# Altium footprint library SG__PCB_HOLE_Connector.PcbLib: 154 footprints (part 6 of 10)
Each footprint in its own frame and in the unit in brackets; x right, y up, seen from the top. Pads: shape width x height; smd on the part's side, far side on the other; paste and mask are expansions set on the pad; w line width, h text height; cw(c..) or ccw(c..) is an arc to the next point about the centre after c.
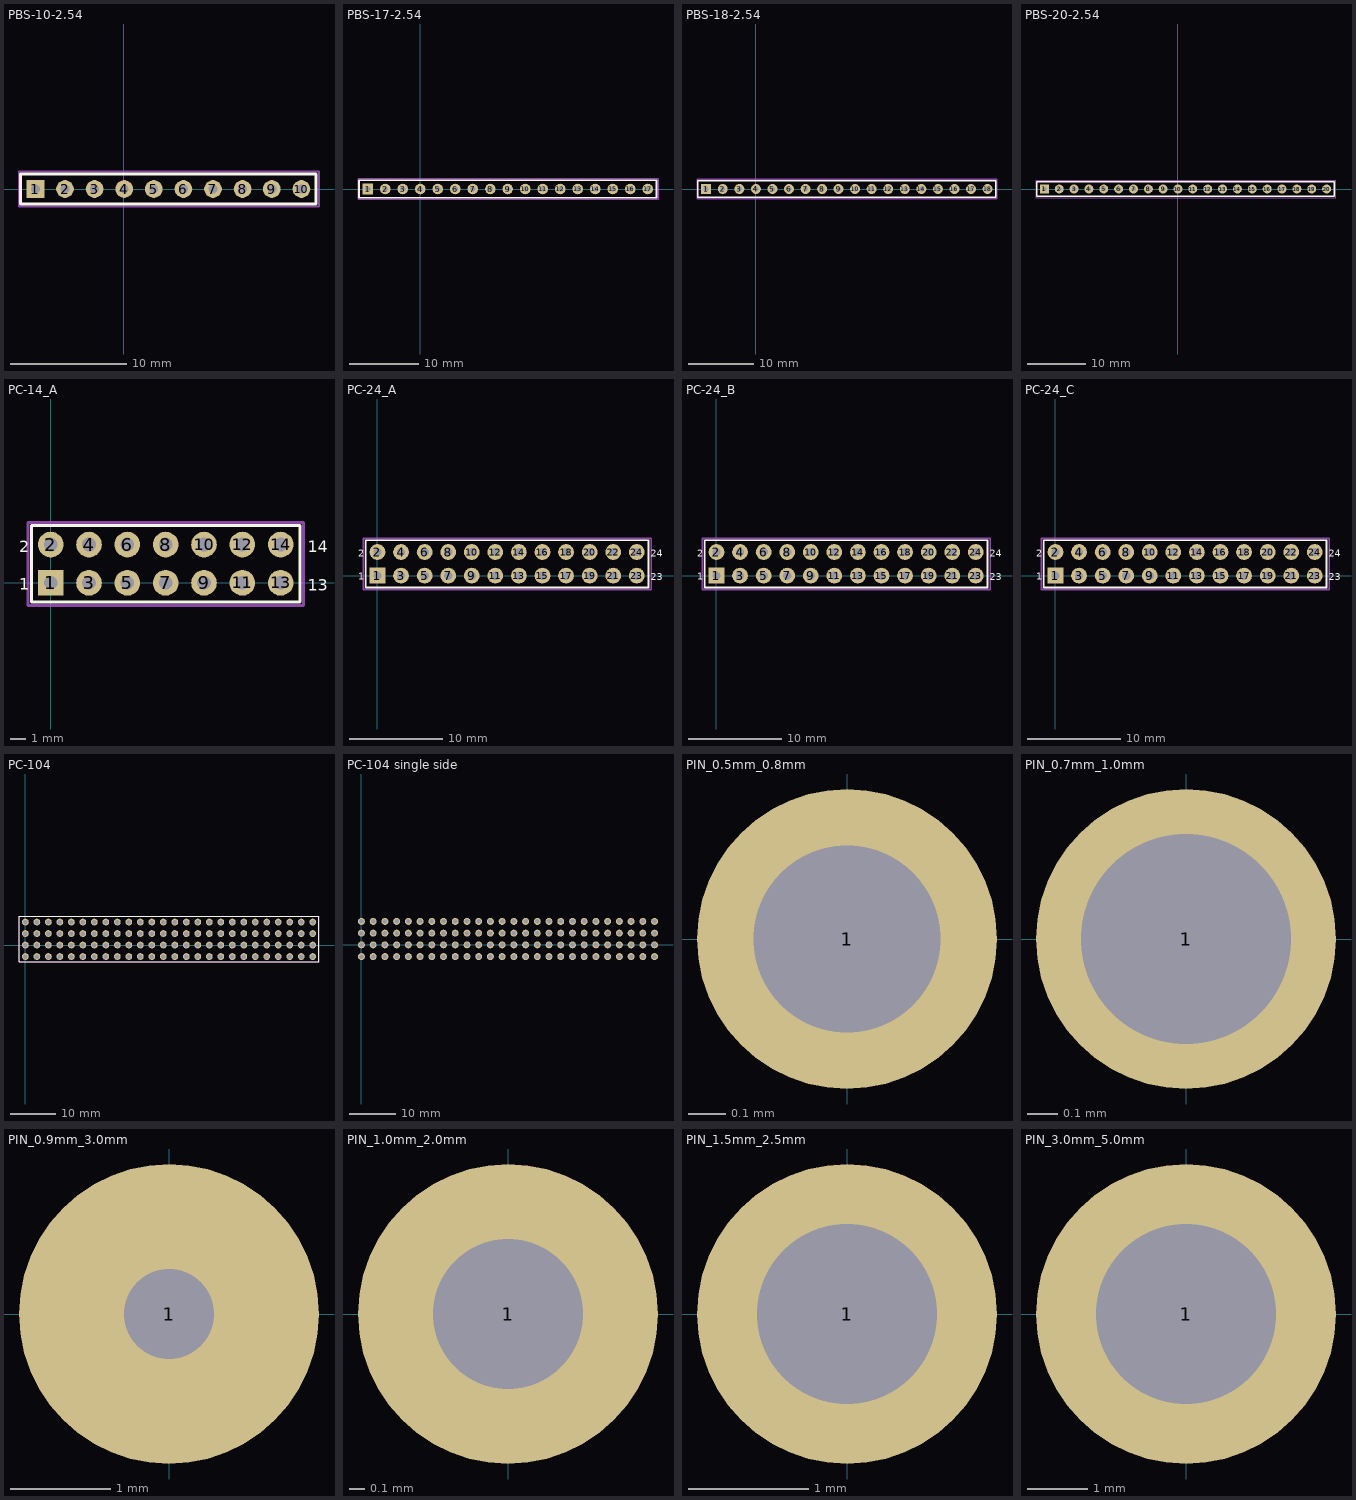
[diagram p5: the footprints below, top view; thin cyan lines are the x and y axes]

## PBS-10-2.54 [mil]
pads (10):
  rect 60x60 hole 30: 1(-298.82,0)
  round 60 hole 30: 2(-198.82,0) 3(-98.82,0) 4(1.18,0) 5(101.18,0) 6(201.18,0) 7(301.18,0) 8(401.18,0) 9(500,0) 10(600,0)
Top Overlay:
  lines w10: 46.85,-50 650,-50 650,50 46.85,50 ; 51.18,-50 -348.82,-50 -348.82,50 51.18,50
Top Courtyard:
  lines w7.87: -354.33,-59.06 -354.33,59.06 659.45,59.06 659.45,-59.06 -354.33,-59.06
3D body "PBS1-2.54.stp": height 334.65, standoff -124.02, extent -148.82,-50 -48.82,50
3D body "PBS1-2.54.stp": height 334.65, standoff -124.02, extent -48.82,-50 51.18,50
3D body "PBS1-2.54.stp": height 334.65, standoff -124.02, extent 51.18,-50 151.18,50
3D body "PBS1-2.54.stp": height 334.65, standoff -124.02, extent 151.18,-50 251.18,50
3D body "PBS1-2.54.stp": height 334.65, standoff -124.02, extent 251.18,-50 351.18,50
3D body "PBS1-2.54.stp": height 334.65, standoff -124.02, extent 351.18,-50 451.18,50
3D body "PBS1-2.54.stp": height 334.65, standoff -124.02, extent 450,-50 550,50
3D body "PBS1-2.54.stp": height 334.65, standoff -124.02, extent 550,-50 650,50
3D body "PBS1-2.54.stp": height 334.65, standoff -124.02, extent -348.82,-50 -248.82,50
3D body "PBS1-2.54.stp": height 334.65, standoff -124.02, extent -248.82,-50 -148.82,50

## PBS-17-2.54 [mil]
pads (17):
  rect 60x60 hole 30: 1(-298.82,0)
  round 60 hole 30: 2(-198.82,0) 3(-98.82,0) 4(1.18,0) 5(101.18,0) 6(201.18,0) 7(301.18,0) 8(401.18,0) 9(500,0) 10(600,0) 11(700,0) 12(800,0) 13(900,0) 14(1000,0) 15(1100,0) 16(1200,0) 17(1300,0)
Top Overlay:
  lines w10: 46.85,-50 1350,-50 1350,50 46.85,50 ; 51.18,-50 -348.82,-50 -348.82,50 51.18,50
Top Courtyard:
  lines w7.87: -354.33,-59.06 -354.33,59.06 1358.27,59.06 1358.27,-59.06 -354.33,-59.06
3D body "PBS1-2.54.stp": height 334.65, standoff -124.02, extent -348.82,-50 -248.82,50
3D body "PBS1-2.54.stp": height 334.65, standoff -124.02, extent -248.82,-50 -148.82,50
3D body "PBS1-2.54.stp": height 334.65, standoff -124.02, extent -148.82,-50 -48.82,50
3D body "PBS1-2.54.stp": height 334.65, standoff -124.02, extent -48.82,-50 51.18,50
3D body "PBS1-2.54.stp": height 334.65, standoff -124.02, extent 51.18,-50 151.18,50
3D body "PBS1-2.54.stp": height 334.65, standoff -124.02, extent 151.18,-50 251.18,50
3D body "PBS1-2.54.stp": height 334.65, standoff -124.02, extent 251.18,-50 351.18,50
3D body "PBS1-2.54.stp": height 334.65, standoff -124.02, extent 351.18,-50 451.18,50
3D body "PBS1-2.54.stp": height 334.65, standoff -124.02, extent 450,-50 550,50
3D body "PBS1-2.54.stp": height 334.65, standoff -124.02, extent 550,-50 650,50
3D body "PBS1-2.54.stp": height 334.65, standoff -124.02, extent 650,-50 750,50
3D body "PBS1-2.54.stp": height 334.65, standoff -124.02, extent 750,-50 850,50
3D body "PBS1-2.54.stp": height 334.65, standoff -124.02, extent 850,-50 950,50
3D body "PBS1-2.54.stp": height 334.65, standoff -124.02, extent 950,-50 1050,50
3D body "PBS1-2.54.stp": height 334.65, standoff -124.02, extent 1050,-50 1150,50
3D body "PBS1-2.54.stp": height 334.65, standoff -124.02, extent 1150,-50 1250,50
3D body "PBS1-2.54.stp": height 334.65, standoff -124.02, extent 1250,-50 1350,50

## PBS-18-2.54 [mil]
pads (18):
  rect 60x60 hole 30: 1(-298.82,0)
  round 60 hole 30: 2(-198.82,0) 3(-98.82,0) 4(1.18,0) 5(101.18,0) 6(201.18,0) 7(301.18,0) 8(401.18,0) 9(500,0) 10(600,0) 11(700,0) 12(800,0) 13(900,0) 14(1000,0) 15(1100,0) 16(1200,0) 17(1300,0) 18(1400,0)
Top Overlay:
  lines w10: 46.85,-50 1450,-50 1450,50 46.85,50 ; 51.18,-50 -348.82,-50 -348.82,50 51.18,50
Top Courtyard:
  lines w7.87: -354.33,-59.06 1456.69,-59.06 1456.69,59.06 -354.33,59.06 -354.33,-59.06
3D body "PBS1-2.54.stp": height 334.65, standoff -124.02, extent 850,-50 950,50
3D body "PBS1-2.54.stp": height 334.65, standoff -124.02, extent 950,-50 1050,50
3D body "PBS1-2.54.stp": height 334.65, standoff -124.02, extent 1050,-50 1150,50
3D body "PBS1-2.54.stp": height 334.65, standoff -124.02, extent 1150,-50 1250,50
3D body "PBS1-2.54.stp": height 334.65, standoff -124.02, extent 1250,-50 1350,50
3D body "PBS1-2.54.stp": height 334.65, standoff -124.02, extent 1350,-50 1450,50
3D body "PBS1-2.54.stp": height 334.65, standoff -124.02, extent -348.82,-50 -248.82,50
3D body "PBS1-2.54.stp": height 334.65, standoff -124.02, extent -248.82,-50 -148.82,50
3D body "PBS1-2.54.stp": height 334.65, standoff -124.02, extent -148.82,-50 -48.82,50
3D body "PBS1-2.54.stp": height 334.65, standoff -124.02, extent -48.82,-50 51.18,50
3D body "PBS1-2.54.stp": height 334.65, standoff -124.02, extent 51.18,-50 151.18,50
3D body "PBS1-2.54.stp": height 334.65, standoff -124.02, extent 151.18,-50 251.18,50
3D body "PBS1-2.54.stp": height 334.65, standoff -124.02, extent 251.18,-50 351.18,50
3D body "PBS1-2.54.stp": height 334.65, standoff -124.02, extent 351.18,-50 451.18,50
3D body "PBS1-2.54.stp": height 334.65, standoff -124.02, extent 450,-50 550,50
3D body "PBS1-2.54.stp": height 334.65, standoff -124.02, extent 550,-50 650,50
3D body "PBS1-2.54.stp": height 334.65, standoff -124.02, extent 650,-50 750,50
3D body "PBS1-2.54.stp": height 334.65, standoff -124.02, extent 750,-50 850,50

## PBS-20-2.54 [mil]
pads (20):
  rect 60x60 hole 30: 1(-898.82,0)
  round 60 hole 30: 2(-798.82,0) 3(-698.82,0) 4(-598.82,0) 5(-498.82,0) 6(-398.82,0) 7(-298.82,0) 8(-198.82,0) 9(-100,0) 10(0,0) 11(100,0) 12(200,0) 13(300,0) 14(400,0) 15(500,0) 16(600,0) 17(700,0) 18(800,0) 19(900,0) 20(1000,0)
Top Overlay:
  lines w10: -553.15,-50 1050.01,-50 1050.01,50 -553.15,50 ; -548.82,-50 -948.82,-50 -948.82,50 -548.82,50
Top Courtyard:
  lines w7.87: -954.72,-59.06 1062.99,-59.06 1062.99,59.06 -954.72,59.06 -954.72,-59.06
3D body "PBS1-2.54.stp": height 334.65, standoff -124.02, extent 850,-50 950,50
3D body "PBS1-2.54.stp": height 334.65, standoff -124.02, extent 750,-50 850,50
3D body "PBS1-2.54.stp": height 334.65, standoff -124.02, extent 650,-50 750,50
3D body "PBS1-2.54.stp": height 334.65, standoff -124.02, extent 550,-50 650,50
3D body "PBS1-2.54.stp": height 334.65, standoff -124.02, extent 450,-50 550,50
3D body "PBS1-2.54.stp": height 334.65, standoff -124.02, extent 350,-50 450,50
3D body "PBS1-2.54.stp": height 334.65, standoff -124.02, extent 250,-50 350,50
3D body "PBS1-2.54.stp": height 334.65, standoff -124.02, extent 150,-50 250,50
3D body "PBS1-2.54.stp": height 334.65, standoff -124.02, extent 50,-50 150,50
3D body "PBS1-2.54.stp": height 334.65, standoff -124.02, extent -50,-50 50,50
3D body "PBS1-2.54.stp": height 334.65, standoff -124.02, extent -150,-50 -50,50
3D body "PBS1-2.54.stp": height 334.65, standoff -124.02, extent -248.82,-50 -148.82,50
3D body "PBS1-2.54.stp": height 334.65, standoff -124.02, extent -348.82,-50 -248.82,50
3D body "PBS1-2.54.stp": height 334.65, standoff -124.02, extent -448.82,-50 -348.82,50
3D body "PBS1-2.54.stp": height 334.65, standoff -124.02, extent -548.82,-50 -448.82,50
3D body "PBS1-2.54.stp": height 334.65, standoff -124.02, extent -648.82,-50 -548.82,50
3D body "PBS1-2.54.stp": height 334.65, standoff -124.02, extent -748.82,-50 -648.82,50
3D body "PBS1-2.54.stp": height 334.65, standoff -124.02, extent -848.82,-50 -748.82,50
3D body "PBS1-2.54.stp": height 334.65, standoff -124.02, extent -948.82,-50 -848.82,50
3D body "PBS1-2.54.stp": height 334.65, standoff -124.02, extent 950,-50 1050,50

## PC-14_A [mm]
pads (14):
  rect 1.7x1.7 hole 0.9: 1(0,0)
  round 1.7 hole 0.9: 2(0,2.54) 3(2.54,0) 4(2.54,2.54) 5(5.08,0) 6(5.08,2.54) 7(7.62,0) 8(7.62,2.54) 9(10.16,0) 10(10.16,2.54) 11(12.7,0) 12(12.7,2.54) 13(15.24,0) 14(15.24,2.54)
Top Overlay:
  lines w0.2: -1.27,-1.27 16.535,-1.27 16.535,3.81 -1.27,3.81 -1.27,-1.27
  text "14" at 17.018,2.032 h0.76
  text "13" at 17.018,-0.508 h0.76
  text "2" at -2.1,2.04 h0.76
  text "1" at -2.1,-0.46 h0.76
Top Courtyard:
  lines w0.2: -1.5,-1.5 -1.5,4 16.75,4 16.75,-1.5 -1.5,-1.5
3D body "PC104-14.stp": height 11.68, standoff -12.32, extent -1.27,-1.39 16.51,3.879

## PC-24_A [mm]
pads (24):
  rect 1.7x1.7 hole 0.9: 1(0,0)
  round 1.7 hole 0.9: 2(0,2.54) 3(2.54,0) 4(2.54,2.54) 5(5.08,0) 6(5.08,2.54) 7(7.62,0) 8(7.62,2.54) 9(10.16,0) 10(10.16,2.54) 11(12.7,0) 12(12.7,2.54) 13(15.24,0) 14(15.24,2.54) 15(17.78,0) 16(17.78,2.54) 17(20.32,0) 18(20.32,2.54) 19(22.86,0) 20(22.86,2.54) 21(25.4,0) 22(25.4,2.54) 23(27.94,0) 24(27.94,2.54)
Top Overlay:
  lines w0.2: -1.27,-1.27 -1.27,3.81 29.21,3.81 29.21,-1.27 -1.27,-1.27
  text "1" at -2.1,-0.46 h0.76
  text "2" at -2.1,2.04 h0.76
  text "23" at 29.464,-0.508 h0.76
  text "24" at 29.464,2.032 h0.76
Top Courtyard:
  lines w0.2: -1.5,-1.5 29.5,-1.5 29.5,4 -1.5,4 -1.5,-1.5
3D body "разъем 12x2 pin 2mm.STEP": height 11, standoff -2, extent -1.4,-1.27 29.34,3.81

## PC-24_B [mm]
pads (24):
  rect 1.7x1.7 hole 0.9: 1(0,0)
  round 1.7 hole 0.9: 2(0,2.54) 3(2.54,0) 4(2.54,2.54) 5(5.08,0) 6(5.08,2.54) 7(7.62,0) 8(7.62,2.54) 9(10.16,0) 10(10.16,2.54) 11(12.7,0) 12(12.7,2.54) 13(15.24,0) 14(15.24,2.54) 15(17.78,0) 16(17.78,2.54) 17(20.32,0) 18(20.32,2.54) 19(22.86,0) 20(22.86,2.54) 21(25.4,0) 22(25.4,2.54) 23(27.94,0) 24(27.94,2.54)
Top Overlay:
  lines w0.2: -1.27,-1.27 -1.27,3.81 29.21,3.81 29.21,-1.27 -1.27,-1.27
  text "1" at -2.1,-0.46 h0.76
  text "2" at -2.1,2.04 h0.76
  text "23" at 29.464,-0.508 h0.76
  text "24" at 29.464,2.032 h0.76
Top Courtyard:
  lines w0.2: -1.5,-1.5 -1.5,4 29.5,4 29.5,-1.5 -1.5,-1.5
3D body "PC-24_B__ByAnRx.SLDPRT": height 11, standoff -7, extent -1.4,-1.27 29.34,3.81

## PC-24_C [mm]
pads (24):
  rect 1.7x1.7 hole 0.9: 1(0,0)
  round 1.7 hole 0.9: 2(0,2.54) 3(2.54,0) 4(2.54,2.54) 5(5.08,0) 6(5.08,2.54) 7(7.62,0) 8(7.62,2.54) 9(10.16,0) 10(10.16,2.54) 11(12.7,0) 12(12.7,2.54) 13(15.24,0) 14(15.24,2.54) 15(17.78,0) 16(17.78,2.54) 17(20.32,0) 18(20.32,2.54) 19(22.86,0) 20(22.86,2.54) 21(25.4,0) 22(25.4,2.54) 23(27.94,0) 24(27.94,2.54)
Top Overlay:
  lines w0.2: -1.27,-1.27 29.21,-1.27 29.21,3.81 -1.27,3.81 -1.27,-1.27
  text "24" at 29.464,2.032 h0.76
  text "23" at 29.464,-0.508 h0.76
  text "2" at -2.1,2.04 h0.76
  text "1" at -2.1,-0.46 h0.76
Top Courtyard:
  lines w0.2: -1.5,-1.5 29.5,-1.5 29.5,4 -1.5,4 -1.5,-1.5
3D body "разъем 12x2 pin.STEP": height 11, standoff -12, extent -1.4,-1.27 29.34,3.81

## PC-104 [mm] "PC104"
pads (104):
  round 1.5 hole 1: 1(0,-2.54) 2(0,0) 3(2.54,-2.54) 4(2.54,0) 5(5.08,-2.54) 6(5.08,0) 7(7.62,-2.54) 8(7.62,0) 9(10.16,-2.54) 10(10.16,0) 11(12.7,-2.54) 12(12.7,0) 13(15.24,-2.54) 14(15.24,0) 15(17.78,-2.54) 16(17.78,0) 17(20.32,-2.54) 18(20.32,0) 19(22.86,-2.54) 20(22.86,0) 21(25.4,-2.54) 22(25.4,0) 23(27.94,-2.54) 24(27.94,0) 25(30.48,-2.54) 26(30.48,0) 27(33.02,-2.54) 28(33.02,0) 29(35.56,-2.54) 30(35.56,0) 31(38.1,-2.54) 32(38.1,0) 33(40.64,-2.54) 34(40.64,0) 35(43.18,-2.54) 36(43.18,0) 37(45.72,-2.54) 38(45.72,0) 39(48.26,-2.54) 40(48.26,0) 41(50.8,-2.54) 42(50.8,0) 43(53.34,-2.54) 44(53.34,0) 45(55.88,-2.54) 46(55.88,0) 47(58.42,-2.54) 48(58.42,0) 49(60.96,-2.54) 50(60.96,0) 51(63.5,-2.54) 52(63.5,0) 53(0,2.54) 54(0,5.08) 55(2.54,2.54) 56(2.54,5.08) 57(5.08,2.54) 58(5.08,5.08) 59(7.62,2.54) 60(7.62,5.08) 61(10.16,2.54) 62(10.16,5.08) 63(12.7,2.54) 64(12.7,5.08) 65(15.24,2.54) 66(15.24,5.08) 67(17.78,2.54) 68(17.78,5.08) 69(20.32,2.54) 70(20.32,5.08) 71(22.86,2.54) 72(22.86,5.08) 73(25.4,2.54) 74(25.4,5.08) 75(27.94,2.54) 76(27.94,5.08) 77(30.48,2.54) 78(30.48,5.08) 79(33.02,2.54) 80(33.02,5.08) 81(35.56,2.54) 82(35.56,5.08) 83(38.1,2.54) 84(38.1,5.08) 85(40.64,2.54) 86(40.64,5.08) 87(43.18,2.54) 88(43.18,5.08) 89(45.72,2.54) 90(45.72,5.08) 91(48.26,2.54) 92(48.26,5.08) 93(50.8,2.54) 94(50.8,5.08) 95(53.34,2.54) 96(53.34,5.08) 97(55.88,2.54) 98(55.88,5.08) 99(58.42,2.54) 100(58.42,5.08) 101(60.96,2.54) 102(60.96,5.08) 103(63.5,2.54) 104(63.5,5.08)
Top Overlay:
  lines w0.254: -1.41,-3.7 64.88,-3.7 64.88,6.38 -1.41,6.38 -1.41,-3.7
Top Assembly:
  lines w0.254: -1.41,-3.7 -1.41,6.38 64.88,6.38 64.88,-3.7 -1.41,-3.7
Top Courtyard:
  lines w0.254: -1.408,-3.706 64.882,-3.706 64.882,6.374 -1.408,6.374 -1.408,-3.706
Bottom Courtyard:
  lines w0.254: -1.409,-3.706 64.881,-3.706 64.881,6.374 -1.409,6.374 -1.409,-3.706
3D body "PC104-52.stp": height 12.23, standoff -11.77, extent -1.41,-3.742 64.63,1.338
3D body "PC104-52.stp": height 12.23, standoff -11.77, extent -1.41,1.338 64.63,6.418

## PC-104 single side [mm] "PC104"
pads (104):
  round 1.5 hole 1: 1(0,-2.54) 2(0,0) 3(2.54,-2.54) 4(2.54,0) 5(5.08,-2.54) 6(5.08,0) 7(7.62,-2.54) 8(7.62,0) 9(10.16,-2.54) 10(10.16,0) 11(12.7,-2.54) 12(12.7,0) 13(15.24,-2.54) 14(15.24,0) 15(17.78,-2.54) 16(17.78,0) 17(20.32,-2.54) 18(20.32,0) 19(22.86,-2.54) 20(22.86,0) 21(25.4,-2.54) 22(25.4,0) 23(27.94,-2.54) 24(27.94,0) 25(30.48,-2.54) 26(30.48,0) 27(33.02,-2.54) 28(33.02,0) 29(35.56,-2.54) 30(35.56,0) 31(38.1,-2.54) 32(38.1,0) 33(40.64,-2.54) 34(40.64,0) 35(43.18,-2.54) 36(43.18,0) 37(45.72,-2.54) 38(45.72,0) 39(48.26,-2.54) 40(48.26,0) 41(50.8,-2.54) 42(50.8,0) 43(53.34,-2.54) 44(53.34,0) 45(55.88,-2.54) 46(55.88,0) 47(58.42,-2.54) 48(58.42,0) 49(60.96,-2.54) 50(60.96,0) 51(63.5,-2.54) 52(63.5,0) 53(0,2.54) 54(0,5.08) 55(2.54,2.54) 56(2.54,5.08) 57(5.08,2.54) 58(5.08,5.08) 59(7.62,2.54) 60(7.62,5.08) 61(10.16,2.54) 62(10.16,5.08) 63(12.7,2.54) 64(12.7,5.08) 65(15.24,2.54) 66(15.24,5.08) 67(17.78,2.54) 68(17.78,5.08) 69(20.32,2.54) 70(20.32,5.08) 71(22.86,2.54) 72(22.86,5.08) 73(25.4,2.54) 74(25.4,5.08) 75(27.94,2.54) 76(27.94,5.08) 77(30.48,2.54) 78(30.48,5.08) 79(33.02,2.54) 80(33.02,5.08) 81(35.56,2.54) 82(35.56,5.08) 83(38.1,2.54) 84(38.1,5.08) 85(40.64,2.54) 86(40.64,5.08) 87(43.18,2.54) 88(43.18,5.08) 89(45.72,2.54) 90(45.72,5.08) 91(48.26,2.54) 92(48.26,5.08) 93(50.8,2.54) 94(50.8,5.08) 95(53.34,2.54) 96(53.34,5.08) 97(55.88,2.54) 98(55.88,5.08) 99(58.42,2.54) 100(58.42,5.08) 101(60.96,2.54) 102(60.96,5.08) 103(63.5,2.54) 104(63.5,5.08)
3D body "female_header_a-bl254-dg-g26d.stp": height 8.5, standoff -3.2, extent 31.61,1.38 64.88,6.38
3D body "female_header_a-bl254-dg-g26d.stp": height 8.5, standoff -3.2, extent 31.61,-3.7 64.88,1.3
3D body "female_header_a-bl254-dg-g26d.stp": height 8.5, standoff -3.2, extent -1.41,-3.7 31.86,1.3
3D body "female_header_a-bl254-dg-g26d.stp": height 8.5, standoff -3.2, extent -1.41,1.38 31.86,6.38

## PIN_0.5mm_0.8mm [mm] "Hole diam, out size diam"
pads (1):
  round 0.8 hole 0.5 mask-0.05: 1(0,0)

## PIN_0.7mm_1.0mm [mm] "Hole diam, out size diam"
pads (1):
  round 1 hole 0.7: 1(0,0)

## PIN_0.9mm_3.0mm [mm] "Hole diam, out size diam"
pads (1):
  round 3 hole 0.9: 1(0,0)

## PIN_1.0mm_2.0mm [mm] "Hole diam, out size diam"
pads (1):
  round 2 hole 1: 1(0,0)

## PIN_1.5mm_2.5mm [mm]
height 12
pads (1):
  round 2.5 hole 1.5: 1(0,0)

## PIN_3.0mm_5.0mm [mm] "Hole diam, out size diam"
height 12
pads (1):
  round 5 hole 3: 1(0,0)